# Altium schematic symbol library IC_TI.SCHLIB: 1162 symbols (part 1 of 8) (continued)
## CC2530F128RHAT (continued)
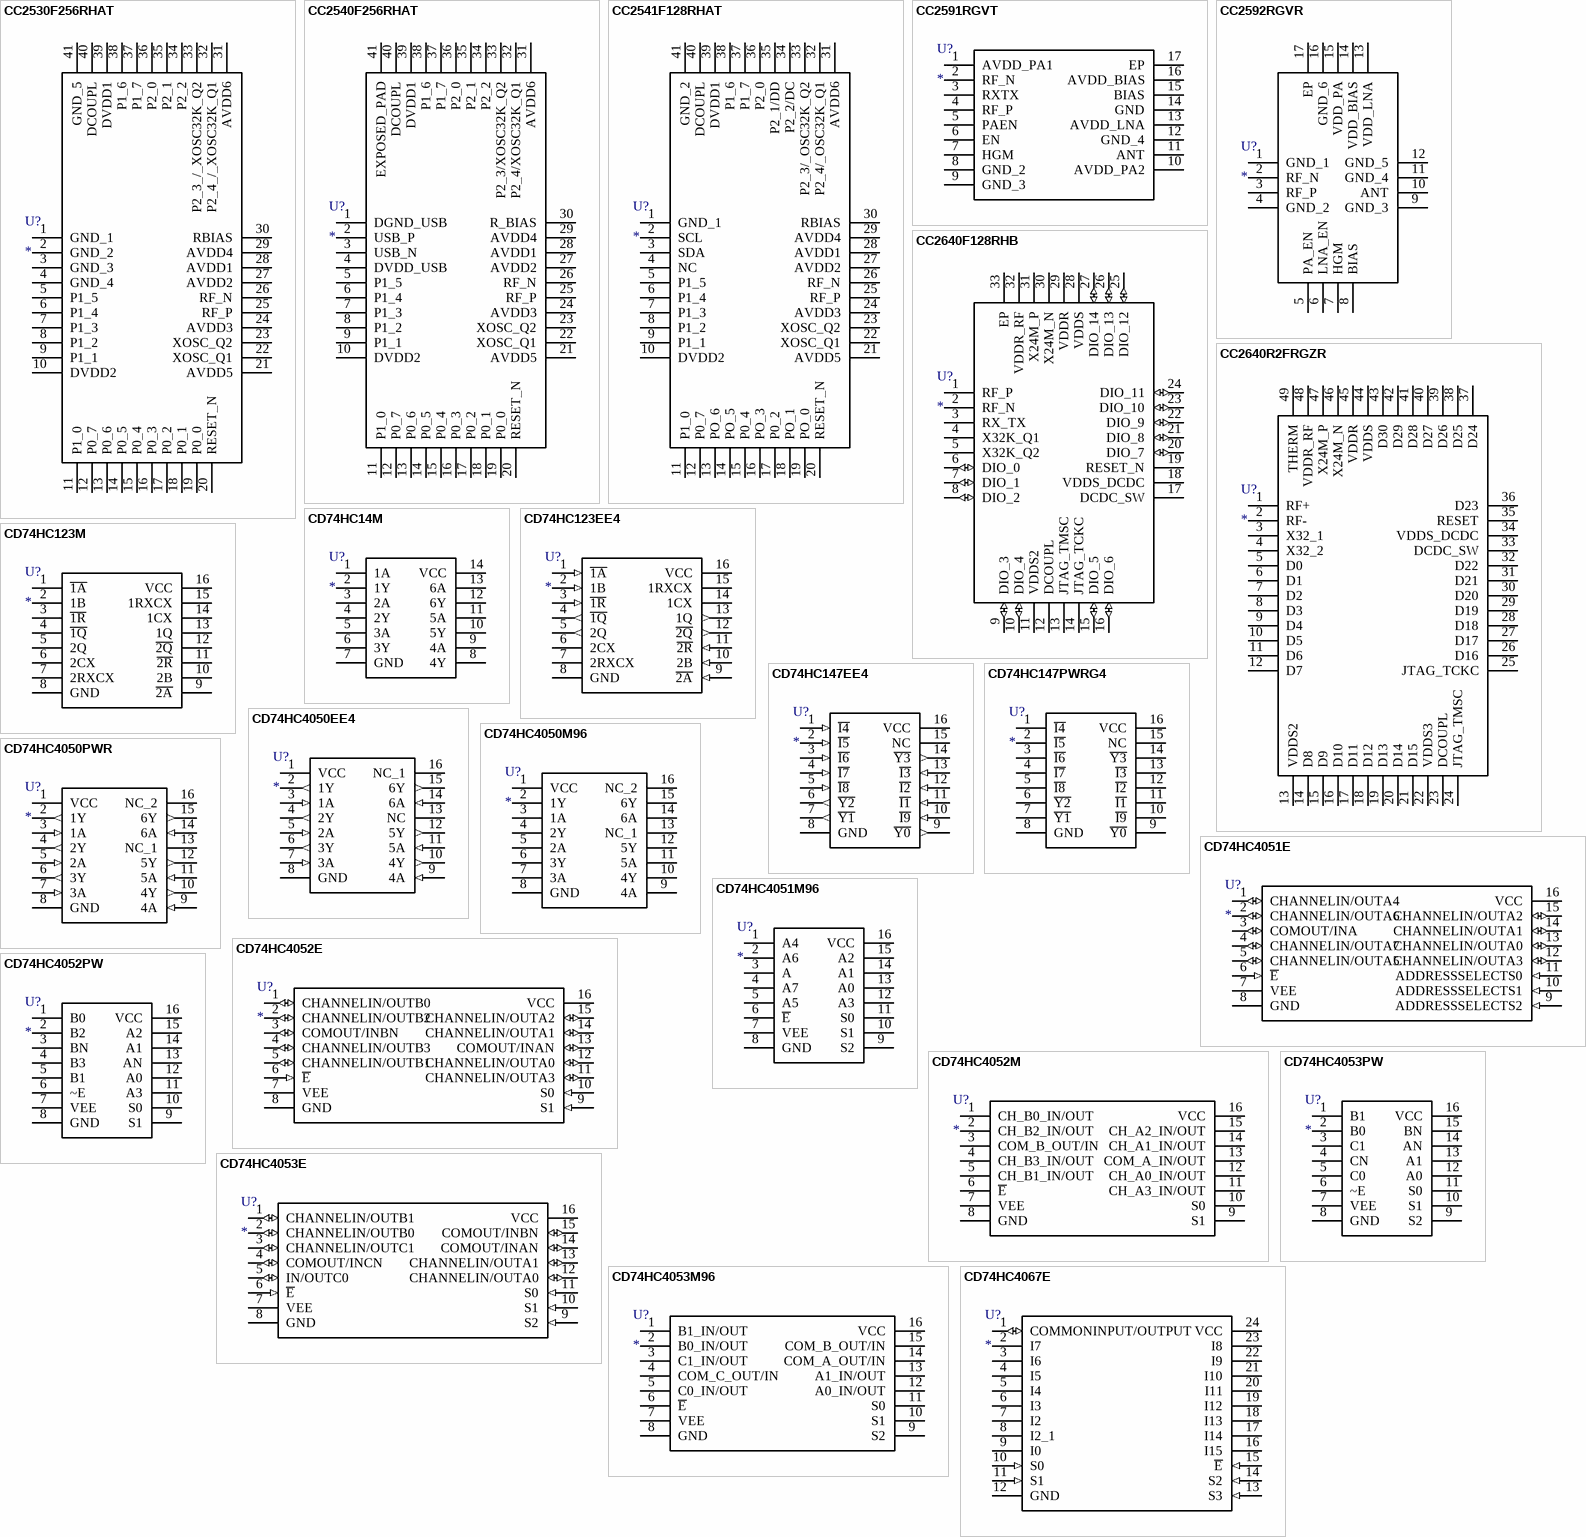
[diagram p2: symbols CC2530F256RHAT to CD74HC4067E]

## CC2530F256RHAT
designator U?
Integrated Circuit; Manufacturer_Name: Texas Instruments; Manufacturer_Part_Number: CC2530F256RHAT; Datasheet Link: http://www.ti.com/lit/ds/symlink/cc2530.pdf; Height: 1mm; Mouser Part Number: 595-CC2530F256RHAT; Mouser Price/Stock: https://www.mouser.com/Search/Refine.aspx?Keyword=595-CC2530F256RHAT; RS Part Number: 6987004P; RS Price/Stock: http://uk.rs-online.com/web/p/products/6987004P
footprint QFN40_0.5-PAD(6X6) (QFN, 40-Leads, Body 6.2x6.2mm (max), Pitch 0.50mm, IPC Low Density)
pins: 1 GND_1, 2 GND_2, 3 GND_3, 4 GND_4, 5 P1_5, 6 P1_4, 7 P1_3, 8 P1_2, 9 P1_1, 10 DVDD2, 11 P1_0, 12 P0_7, 13 P0_6, 14 P0_5, 15 P0_4, 16 P0_3, 17 P0_2, 18 P0_1, 19 P0_0, 20 RESET_N, 21 AVDD5, 22 XOSC_Q1, 23 XOSC_Q2, 24 AVDD3, 25 RF_P, 26 RF_N, 27 AVDD2, 28 AVDD1, 29 AVDD4, 30 RBIAS, 31 AVDD6, 32 P2_4_/_XOSC32K_Q1, 33 P2_3_/_XOSC32K_Q2, 34 P2_2, 35 P2_1, 36 P2_0, 37 P1_7, 38 P1_6, 39 DVDD1, 40 DCOUPL, 41 GND_5

## CC2540F256RHAT
designator U?
Integrated Circuit; Manufacturer_Name: Texas Instruments; Manufacturer_Part_Number: CC2540F256RHAT; Datasheet Link: http://www.ti.com/lit/ds/symlink/cc2540.pdf; Height: 1mm; Mouser Part Number: 595-CC2540F256RHAT; Mouser Price/Stock: https://www.mouser.com/Search/Refine.aspx?Keyword=595-CC2540F256RHAT; RS Part Number: 1684136; RS Price/Stock: http://uk.rs-online.com/web/p/products/1684136
footprint QFN40_0.5-PAD(6X6) (QFN, 40-Leads, Body 6.2x6.2mm (max), Pitch 0.50mm, IPC Low Density)
pins: 1 DGND_USB (power), 2 USB_P, 3 USB_N, 4 DVDD_USB (power), 5 P1_5, 6 P1_4, 7 P1_3, 8 P1_2, 9 P1_1, 10 DVDD2 (power), 11 P1_0, 12 P0_7, 13 P0_6, 14 P0_5, 15 P0_4, 16 P0_3, 17 P0_2, 18 P0_1, 19 P0_0, 20 RESET_N, 21 AVDD5 (power), 22 XOSC_Q1, 23 XOSC_Q2, 24 AVDD3 (power), 25 RF_P, 26 RF_N, 27 AVDD2 (power), 28 AVDD1 (power), 29 AVDD4 (power), 30 R_BIAS, 31 AVDD6 (power), 32 P2_4/XOSC32K_Q1, 33 P2_3/XOSC32K_Q2, 34 P2_2, 35 P2_1, 36 P2_0, 37 P1_7, 38 P1_6, 39 DVDD1 (power), 40 DCOUPL, 41 EXPOSED_PAD

## CC2541F128RHAT
designator U?
Integrated Circuit; Manufacturer_Name: Texas Instruments; Manufacturer_Part_Number: CC2541F128RHAT; Datasheet Link: http://docs-emea.rs-online.com/webdocs/130f/0900766b8130f4c3.pdf; Height: 1mm; Mouser Part Number: 595-CC2541F128RHAT; Mouser Price/Stock: https://www.mouser.com/Search/Refine.aspx?Keyword=595-CC2541F128RHAT; RS Part Number: 1628121; RS Price/Stock: http://china.rs-online.com/web/p/products/1628121
footprint QFN40_0.5-PAD(6X6) (QFN, 40-Leads, Body 6.2x6.2mm (max), Pitch 0.50mm, IPC Low Density)
pins: 1 GND_1 (power), 2 SCL, 3 SDA, 4 NC, 5 P1_5, 6 P1_4, 7 P1_3, 8 P1_2, 9 P1_1, 10 DVDD2 (power), 11 P1_0, 12 P0_7, 13 PO_6, 14 PO_5, 15 P0_4, 16 PO_3, 17 P0_2, 18 PO_1, 19 PO_0, 20 RESET_N, 21 AVDD5 (power), 22 XOSC_Q1, 23 XOSC_Q2, 24 AVDD3 (power), 25 RF_P, 26 RF_N, 27 AVDD2 (power), 28 AVDD1 (power), 29 AVDD4 (power), 30 RBIAS, 31 AVDD6 (power), 32 P2_4/_OSC32K_Q1, 33 P2_3/_OSC32K_Q2, 34 P2_2/DC, 35 P2_1/DD, 36 P2_0, 37 P1_7, 38 P1_6, 39 DVDD1 (power), 40 DCOUPL, 41 GND_2 (power)

## CC2591RGVT
designator U?
Integrated Circuit; Manufacturer_Name: Texas Instruments; Manufacturer_Part_Number: CC2591RGVT; Datasheet Link: http://www.ti.com/lit/gpn/cc2591; Mouser Part Number: 595-CC2591RGVT; Mouser Price/Stock: https://www.mouser.com/Search/Refine.aspx?Keyword=595-CC2591RGVT; RS Part Number: 6658618P; RS Price/Stock: http://uk.rs-online.com/web/p/products/6658618P
footprint QFN16_0.65-PAD(4x4) (QFN, 16-Leads, Body 3.0x3.0mm (max), Pitch 0.50mm, IPC Low Density)
pins: 1 AVDD_PA1, 2 RF_N, 3 RXTX, 4 RF_P, 5 PAEN, 6 EN, 7 HGM, 8 GND_2, 9 GND_3, 10 AVDD_PA2, 11 ANT, 12 GND_4, 13 AVDD_LNA, 14 GND, 15 BIAS, 16 AVDD_BIAS, 17 EP

## CC2592RGVR
designator U?
Integrated Circuit; Manufacturer_Name: Texas Instruments; Manufacturer_Part_Number: CC2592RGVR; Datasheet Link: http://www.ti.com/lit/gpn/cc2592; Height: 1mm; Mouser Part Number: 595-CC2592RGVR; Mouser Price/Stock: https://www.mouser.com/Search/Refine.aspx?Keyword=595-CC2592RGVR
footprint QFN16_0.65-PAD(4x4) (QFN, 16-Leads, Body 3.0x3.0mm (max), Pitch 0.50mm, IPC Low Density)
pins: 1 GND_1, 2 RF_N, 3 RF_P, 4 GND_2, 5 PA_EN, 6 LNA_EN, 7 HGM, 8 BIAS, 9 GND_3, 10 ANT, 11 GND_4, 12 GND_5, 13 VDD_LNA, 14 VDD_BIAS, 15 VDD_PA, 16 GND_6, 17 EP

## CC2640F128RHB
designator U?
Integrated Circuit; Manufacturer_Name: Texas Instruments; Manufacturer_Part_Number: CC2640F128RHB; Datasheet Link: http://www.ti.com/lit/ds/symlink/cc2640.pdf; Height: 1mm
footprint QFN32_0.5-PAD(5X5) (QFN, 32-Leads, Body 5.2x5.2mm (max), Pitch 0.50mm, IPC Medium Density)
pins: 1 RF_P, 2 RF_N, 3 RX_TX, 4 X32K_Q1, 5 X32K_Q2, 6 DIO_0 (io), 7 DIO_1 (io), 8 DIO_2 (io), 9 DIO_3 (io), 10 DIO_4 (io), 11 VDDS2 (power), 12 DCOUPL, 13 JTAG_TMSC, 14 JTAG_TCKC, 15 DIO_5 (io), 16 DIO_6 (io), 17 DCDC_SW, 18 VDDS_DCDC (power), 19 RESET_N, 20 DIO_7 (io), 21 DIO_8 (io), 22 DIO_9 (io), 23 DIO_10 (io), 24 DIO_11 (io), 25 DIO_12 (io), 26 DIO_13 (io), 27 DIO_14 (io), 28 VDDS (power), 29 VDDR (power), 30 X24M_N, 31 X24M_P, 32 VDDR_RF (power), 33 EP

## CC2640R2FRGZR
designator U?
Integrated Circuit; Manufacturer_Name: Texas Instruments; Manufacturer_Part_Number: CC2640R2FRGZR; Datasheet Link: http://www.ti.com/lit/gpn/cc2640r2f; Height: 1mm; Mouser Part Number: 595-CC2640R2FRGZR; Mouser Price/Stock: https://www.mouser.com/Search/Refine.aspx?Keyword=595-CC2640R2FRGZR
footprint QFN48_0.5-PAD(7X7) (QFN, 48-Leads, Body 7.2x7.2mm (max), Pitch 0.50mm, IPC Medium Density)
pins: 1 RF+, 2 RF-, 3 X32_1, 4 X32_2, 5 D0, 6 D1, 7 D2, 8 D3, 9 D4, 10 D5, 11 D6, 12 D7, 13 VDDS2, 14 D8, 15 D9, 16 D10, 17 D11, 18 D12, 19 D13, 20 D14, 21 D15, 22 VDDS3, 23 DCOUPL, 24 JTAG_TMSC, 25 JTAG_TCKC, 26 D16, 27 D17, 28 D18, 29 D19, 30 D20, 31 D21, 32 D22, 33 DCDC_SW, 34 VDDS_DCDC, 35 RESET, 36 D23, 37 D24, 38 D25, 39 D26, 40 D27, 41 D28, 42 D29, 43 D30, 44 VDDS, 45 VDDR, 46 X24M_N, 47 X24M_P, 48 VDDR_RF, 49 THERM

## CD74HC14M
designator U?
Integrated Circuit; Manufacturer_Name: Texas Instruments; Manufacturer_Part_Number: CD74HC14M; Datasheet Link: http://docs-emea.rs-online.com/webdocs/0ca1/0900766b80ca103b.pdf; Height: 1.75mm; Mouser Part Number: 595-CD74HC14M; Mouser Price/Stock: https://www.mouser.com/Search/Refine.aspx?Keyword=595-CD74HC14M; RS Part Number: 1450149; RS Price/Stock: http://uk.rs-online.com/web/p/products/1450149
footprint SOIC14_1.27
pins: 1 1A, 2 1Y, 3 2A, 4 2Y, 5 3A, 6 3Y, 7 GND (power), 8 4Y, 9 4A, 10 5Y, 11 5A, 12 6Y, 13 6A, 14 VCC (power)

## CD74HC123EE4
designator U?
Integrated Circuit; Manufacturer_Name: Texas Instruments; Manufacturer_Part_Number: CD74HC123EE4; Datasheet Link: http://www.ti.com/lit/ds/symlink/cd74hc123.pdf; Height: 5.08mm; Mouser Part Number: 595-CD74HC123EE4; Mouser Price/Stock: https://www.mouser.com/Search/Refine.aspx?Keyword=595-CD74HC123EE4; RS Part Number: 7092071P; RS Price/Stock: http://uk.rs-online.com/web/p/products/7092071P
footprint DIP16-A
pins: 1 ~{1A} (in), 2 1B (in), 3 ~{1R} (in), 4 ~{1Q} (out), 5 2Q (out), 6 2CX, 7 2RXCX, 8 GND (power), 9 ~{2A} (in), 10 2B (in), 11 ~{2R} (in), 12 ~{2Q} (out), 13 1Q (out), 14 1CX, 15 1RXCX, 16 VCC (power)

## CD74HC123M
designator U?
Integrated Circuit; Manufacturer_Name: Texas Instruments; Manufacturer_Part_Number: CD74HC123M; Datasheet Link: http://www.ti.com/lit/ds/symlink/cd74hc123.pdf; Height: 1.75mm; Mouser Part Number: 595-CD74HC123M; Mouser Price/Stock: https://www.mouser.com/Search/Refine.aspx?Keyword=595-CD74HC123M; RS Part Number: 6630014P; RS Price/Stock: http://uk.rs-online.com/web/p/products/6630014P
footprint SOIC16_1.27
pins: 1 ~{1A}, 2 1B, 3 ~{1R}, 4 ~{1Q}, 5 2Q, 6 2CX, 7 2RXCX, 8 GND, 9 ~{2A}, 10 2B, 11 ~{2R}, 12 ~{2Q}, 13 1Q, 14 1CX, 15 1RXCX, 16 VCC

## CD74HC147EE4
designator U?
Integrated Circuit; Manufacturer_Name: Texas Instruments; Manufacturer_Part_Number: CD74HC147EE4; Datasheet Link: http://www.ti.com/lit/ds/symlink/cd74hc147.pdf; Height: 5.08mm; Mouser Part Number: 595-CD74HC147EE4; Mouser Price/Stock: https://www.mouser.com/Search/Refine.aspx?Keyword=595-CD74HC147EE4; RS Part Number: 1450477; RS Price/Stock: http://uk.rs-online.com/web/p/products/1450477
footprint DIP16-A
pins: 1 ~{I4} (in), 2 ~{I5} (in), 3 ~{I6} (in), 4 ~{I7} (in), 5 ~{I8} (in), 6 ~{Y2} (out), 7 ~{Y1} (out), 8 GND (power), 9 ~{Y0} (out), 10 ~{I9} (in), 11 ~{I1} (in), 12 ~{I2} (in), 13 ~{I3} (in), 14 ~{Y3} (out), 15 NC, 16 VCC (power)

## CD74HC147PWRG4
designator U?
Integrated Circuit; Manufacturer_Name: Texas Instruments; Manufacturer_Part_Number: CD74HC147PWRG4; Datasheet Link: http://www.ti.com/lit/ds/symlink/cd74hc147.pdf; Height: 1.2mm; Mouser Part Number: 595-CD74HC147PWRG4; Mouser Price/Stock: https://www.mouser.com/Search/Refine.aspx?Keyword=595-CD74HC147PWRG4
footprint TSSOP16_0.65 (Shrink Small Outline; 16 Leads; Body Width 4.4 mm; Pitch 0.65 mm)
pins: 1 ~{I4}, 2 ~{I5}, 3 ~{I6}, 4 ~{I7}, 5 ~{I8}, 6 ~{Y2}, 7 ~{Y1}, 8 GND, 9 ~{Y0}, 10 ~{I9}, 11 ~{I1}, 12 ~{I2}, 13 ~{I3}, 14 ~{Y3}, 15 NC, 16 VCC

## CD74HC4050EE4
designator U?
Integrated Circuit; Manufacturer_Name: Texas Instruments; Manufacturer_Part_Number: CD74HC4050EE4; Datasheet Link: http://www.ti.com/lit/ds/symlink/cd74hc4050.pdf; Height: 5.08mm; Mouser Part Number: 595-CD74HC4050EE4; Mouser Price/Stock: https://www.mouser.com/Search/Refine.aspx?Keyword=595-CD74HC4050EE4; RS Part Number: 1450019; RS Price/Stock: http://uk.rs-online.com/web/p/products/1450019
footprint DIP16-A
pins: 1 VCC (power), 2 1Y (out), 3 1A (in), 4 2Y (out), 5 2A (in), 6 3Y (out), 7 3A (in), 8 GND (power), 9 4A (in), 10 4Y (out), 11 5A (in), 12 5Y (out), 13 NC, 14 6A (in), 15 6Y (out), 16 NC_1

## CD74HC4050M96
designator U?
Integrated Circuit; Manufacturer_Name: Texas Instruments; Manufacturer_Part_Number: CD74HC4050M96; Datasheet Link: http://www.ti.com/lit/gpn/cd74hc4050; Height: 1.75mm; Mouser Part Number: 595-CD74HC4050M96; Mouser Price/Stock: https://www.mouser.com/Search/Refine.aspx?Keyword=595-CD74HC4050M96; RS Part Number: 6627137P; RS Price/Stock: http://uk.rs-online.com/web/p/products/6627137P
footprint SOIC16_1.27
pins: 1 VCC, 2 1Y, 3 1A, 4 2Y, 5 2A, 6 3Y, 7 3A, 8 GND, 9 4A, 10 4Y, 11 5A, 12 5Y, 13 NC_1, 14 6A, 15 6Y, 16 NC_2

## CD74HC4050PWR
designator U?
Integrated Circuit; Manufacturer_Name: Texas Instruments; Manufacturer_Part_Number: CD74HC4050PWR; Datasheet Link: http://www.ti.com/lit/ds/symlink/cd74hc4049.pdf; Height: 1.2mm; Mouser Part Number: 595-CD74HC4050PWR; Mouser Price/Stock: https://www.mouser.com/Search/Refine.aspx?Keyword=595-CD74HC4050PWR; RS Part Number: 6627131P; RS Price/Stock: http://uk.rs-online.com/web/p/products/6627131P
footprint TSSOP16_0.65 (Shrink Small Outline; 16 Leads; Body Width 4.4 mm; Pitch 0.65 mm)
pins: 1 VCC (power), 2 1Y (out), 3 1A (in), 4 2Y (out), 5 2A (in), 6 3Y (out), 7 3A (in), 8 GND (power), 9 4A (in), 10 4Y (out), 11 5A (in), 12 5Y (out), 13 NC_1, 14 6A (in), 15 6Y (out), 16 NC_2

## CD74HC4051E
designator U?
Integrated Circuit; Manufacturer_Name: Texas Instruments; Manufacturer_Part_Number: CD74HC4051E; Datasheet Link: http://www.ti.com/lit/ds/symlink/cd74hc4051.pdf; Height: 5.08mm; Mouser Part Number: 595-CD74HC4051E; Mouser Price/Stock: https://www.mouser.com/Search/Refine.aspx?Keyword=595-CD74HC4051E; RS Part Number: 2508240054; RS Price/Stock: http://uk.rs-online.com/web/p/products/2508240054
footprint DIP16-A
pins: 1 CHANNELIN/OUTA4 (io), 2 CHANNELIN/OUTA6 (io), 3 COMOUT/INA (io), 4 CHANNELIN/OUTA7 (io), 5 CHANNELIN/OUTA5 (io), 6 ~{E} (in), 7 VEE (power), 8 GND (power), 9 ADDRESSSELECTS2 (in), 10 ADDRESSSELECTS1 (in), 11 ADDRESSSELECTS0 (in), 12 CHANNELIN/OUTA3 (io), 13 CHANNELIN/OUTA0 (io), 14 CHANNELIN/OUTA1 (io), 15 CHANNELIN/OUTA2 (io), 16 VCC (power)

## CD74HC4051M96
designator U?
Integrated Circuit; Manufacturer_Name: Texas Instruments; Manufacturer_Part_Number: CD74HC4051M96; Datasheet Link: http://www.ti.com/lit/ds/symlink/cd74hc4051.pdf; Height: 1.75mm; Mouser Part Number: 595-CD74HC4051M96; Mouser Price/Stock: https://www.mouser.com/Search/Refine.aspx?Keyword=595-CD74HC4051M96; RS Part Number: 1788943; RS Price/Stock: http://uk.rs-online.com/web/p/products/1788943
footprint SOIC16_1.27
pins: 1 A4, 2 A6, 3 A, 4 A7, 5 A5, 6 ~{E}, 7 VEE, 8 GND (power), 9 S2, 10 S1, 11 S0, 12 A3, 13 A0, 14 A1, 15 A2, 16 VCC (power)

## CD74HC4052E
designator U?
Integrated Circuit; Manufacturer_Name: Texas Instruments; Manufacturer_Part_Number: CD74HC4052E; Datasheet Link: http://www.ti.com/lit/ds/symlink/cd74hc4051.pdf; Height: 5.08mm; Mouser Part Number: 595-CD74HC4052E; Mouser Price/Stock: https://www.mouser.com/Search/Refine.aspx?Keyword=595-CD74HC4052E; RS Part Number: 0527754; RS Price/Stock: http://uk.rs-online.com/web/p/products/0527754
footprint DIP16-A
pins: 1 CHANNELIN/OUTB0 (io), 2 CHANNELIN/OUTB2 (io), 3 COMOUT/INBN (io), 4 CHANNELIN/OUTB3 (io), 5 CHANNELIN/OUTB1 (io), 6 ~{E} (in), 7 VEE (power), 8 GND (power), 9 S1 (in), 10 S0 (in), 11 CHANNELIN/OUTA3 (io), 12 CHANNELIN/OUTA0 (io), 13 COMOUT/INAN (io), 14 CHANNELIN/OUTA1 (io), 15 CHANNELIN/OUTA2 (io), 16 VCC (power)

## CD74HC4052M
designator U?
Integrated Circuit; Manufacturer_Name: Texas Instruments; Manufacturer_Part_Number: CD74HC4052M; Datasheet Link: http://www.ti.com/lit/ds/symlink/cd74hc4052.pdf; Height: 1.75mm; Mouser Part Number: 595-CD74HC4052M; Mouser Price/Stock: https://www.mouser.com/Search/Refine.aspx?Keyword=595-CD74HC4052M; RS Part Number: 6622684P; RS Price/Stock: http://uk.rs-online.com/web/p/products/6622684P
footprint SOIC16_1.27
pins: 1 CH_B0_IN/OUT, 2 CH_B2_IN/OUT, 3 COM_B_OUT/IN, 4 CH_B3_IN/OUT, 5 CH_B1_IN/OUT, 6 ~{E}, 7 VEE, 8 GND, 9 S1, 10 S0, 11 CH_A3_IN/OUT, 12 CH_A0_IN/OUT, 13 COM_A_IN/OUT, 14 CH_A1_IN/OUT, 15 CH_A2_IN/OUT, 16 VCC

## CD74HC4052PW
designator U?
Integrated Circuit; Manufacturer_Name: Texas Instruments; Manufacturer_Part_Number: CD74HC4052PW; Mouser Part Number: 595-CD74HC4052PW; Mouser Price/Stock: https://www.mouser.com/Search/Refine.aspx?Keyword=595-CD74HC4052PW
footprint TSSOP16_0.65 (Shrink Small Outline; 16 Leads; Body Width 4.4 mm; Pitch 0.65 mm)
pins: 1 B0, 2 B2, 3 BN, 4 B3, 5 B1, 6 ~E, 7 VEE, 8 GND, 9 S1, 10 S0, 11 A3, 12 A0, 13 AN, 14 A1, 15 A2, 16 VCC

## CD74HC4053E
designator U?
Integrated Circuit; Manufacturer_Name: Texas Instruments; Manufacturer_Part_Number: CD74HC4053E; Datasheet Link: http://www.ti.com/lit/ds/symlink/cd74hc4051.pdf; Height: 5.08mm; Mouser Part Number: 595-CD74HC4053E; Mouser Price/Stock: https://www.mouser.com/Search/Refine.aspx?Keyword=595-CD74HC4053E; RS Part Number: 2508240111; RS Price/Stock: http://uk.rs-online.com/web/p/products/2508240111
footprint DIP16-A
pins: 1 CHANNELIN/OUTB1 (io), 2 CHANNELIN/OUTB0 (io), 3 CHANNELIN/OUTC1 (io), 4 COMOUT/INCN (io), 5 IN/OUTC0 (io), 6 ~{E} (in), 7 VEE (power), 8 GND (power), 9 S2 (in), 10 S1 (in), 11 S0 (in), 12 CHANNELIN/OUTA0 (io), 13 CHANNELIN/OUTA1 (io), 14 COMOUT/INAN (io), 15 COMOUT/INBN (io), 16 VCC (power)

## CD74HC4053M96
designator U?
Integrated Circuit; Manufacturer_Name: Texas Instruments; Manufacturer_Part_Number: CD74HC4053M96; Datasheet Link: http://www.ti.com/lit/ds/symlink/cd74hc4053.pdf; Height: 1.75mm; Mouser Part Number: 595-CD74HC4053M96; Mouser Price/Stock: https://www.mouser.com/Search/Refine.aspx?Keyword=595-CD74HC4053M96; RS Part Number: 6622561P; RS Price/Stock: http://uk.rs-online.com/web/p/products/6622561P
footprint SOIC16_1.27
pins: 1 B1_IN/OUT, 2 B0_IN/OUT, 3 C1_IN/OUT, 4 COM_C_OUT/IN, 5 C0_IN/OUT, 6 ~{E}, 7 VEE, 8 GND, 9 S2, 10 S1, 11 S0, 12 A0_IN/OUT, 13 A1_IN/OUT, 14 COM_A_OUT/IN, 15 COM_B_OUT/IN, 16 VCC

## CD74HC4053PW
designator U?
Integrated Circuit; Manufacturer_Name: Texas Instruments; Manufacturer_Part_Number: CD74HC4053PW; Datasheet Link: http://componentsearchengine.com/Datasheets/1/CD74HC4053PW.pdf; Mouser Part Number: 595-CD74HC4053PW; Mouser Price/Stock: https://www.mouser.com/Search/Refine.aspx?Keyword=595-CD74HC4053PW; RS Part Number: 6622681P; RS Price/Stock: http://uk.rs-online.com/web/p/products/6622681P
footprint TSSOP16_0.65 (Shrink Small Outline; 16 Leads; Body Width 4.4 mm; Pitch 0.65 mm)
pins: 1 B1, 2 B0, 3 C1, 4 CN, 5 C0, 6 ~E, 7 VEE, 8 GND, 9 S2, 10 S1, 11 S0, 12 A0, 13 A1, 14 AN, 15 BN, 16 VCC

## CD74HC4067E
designator U?
Integrated Circuit; Manufacturer_Name: Texas Instruments; Manufacturer_Part_Number: CD74HC4067E; Datasheet Link: http://docs-emea.rs-online.com/webdocs/13d3/0900766b813d37cd.pdf; Height: 5.08mm; Mouser Part Number: 595-CD74HC4067E; Mouser Price/Stock: https://www.mouser.com/Search/Refine.aspx?Keyword=595-CD74HC4067E; RS Part Number: 6622707P; RS Price/Stock: http://uk.rs-online.com/web/p/products/6622707P
footprint DIP24W
pins: 1 COMMONINPUT/OUTPUT (io), 2 I7, 3 I6, 4 I5, 5 I4, 6 I3, 7 I2, 8 I2_1, 9 I0, 10 S0 (in), 11 S1 (in), 12 GND (power), 13 S3 (in), 14 S2 (in), 15 ~{E} (in), 16 I15, 17 I14, 18 I13, 19 I12, 20 I11, 21 I10, 22 I9, 23 I8, 24 VCC (power)

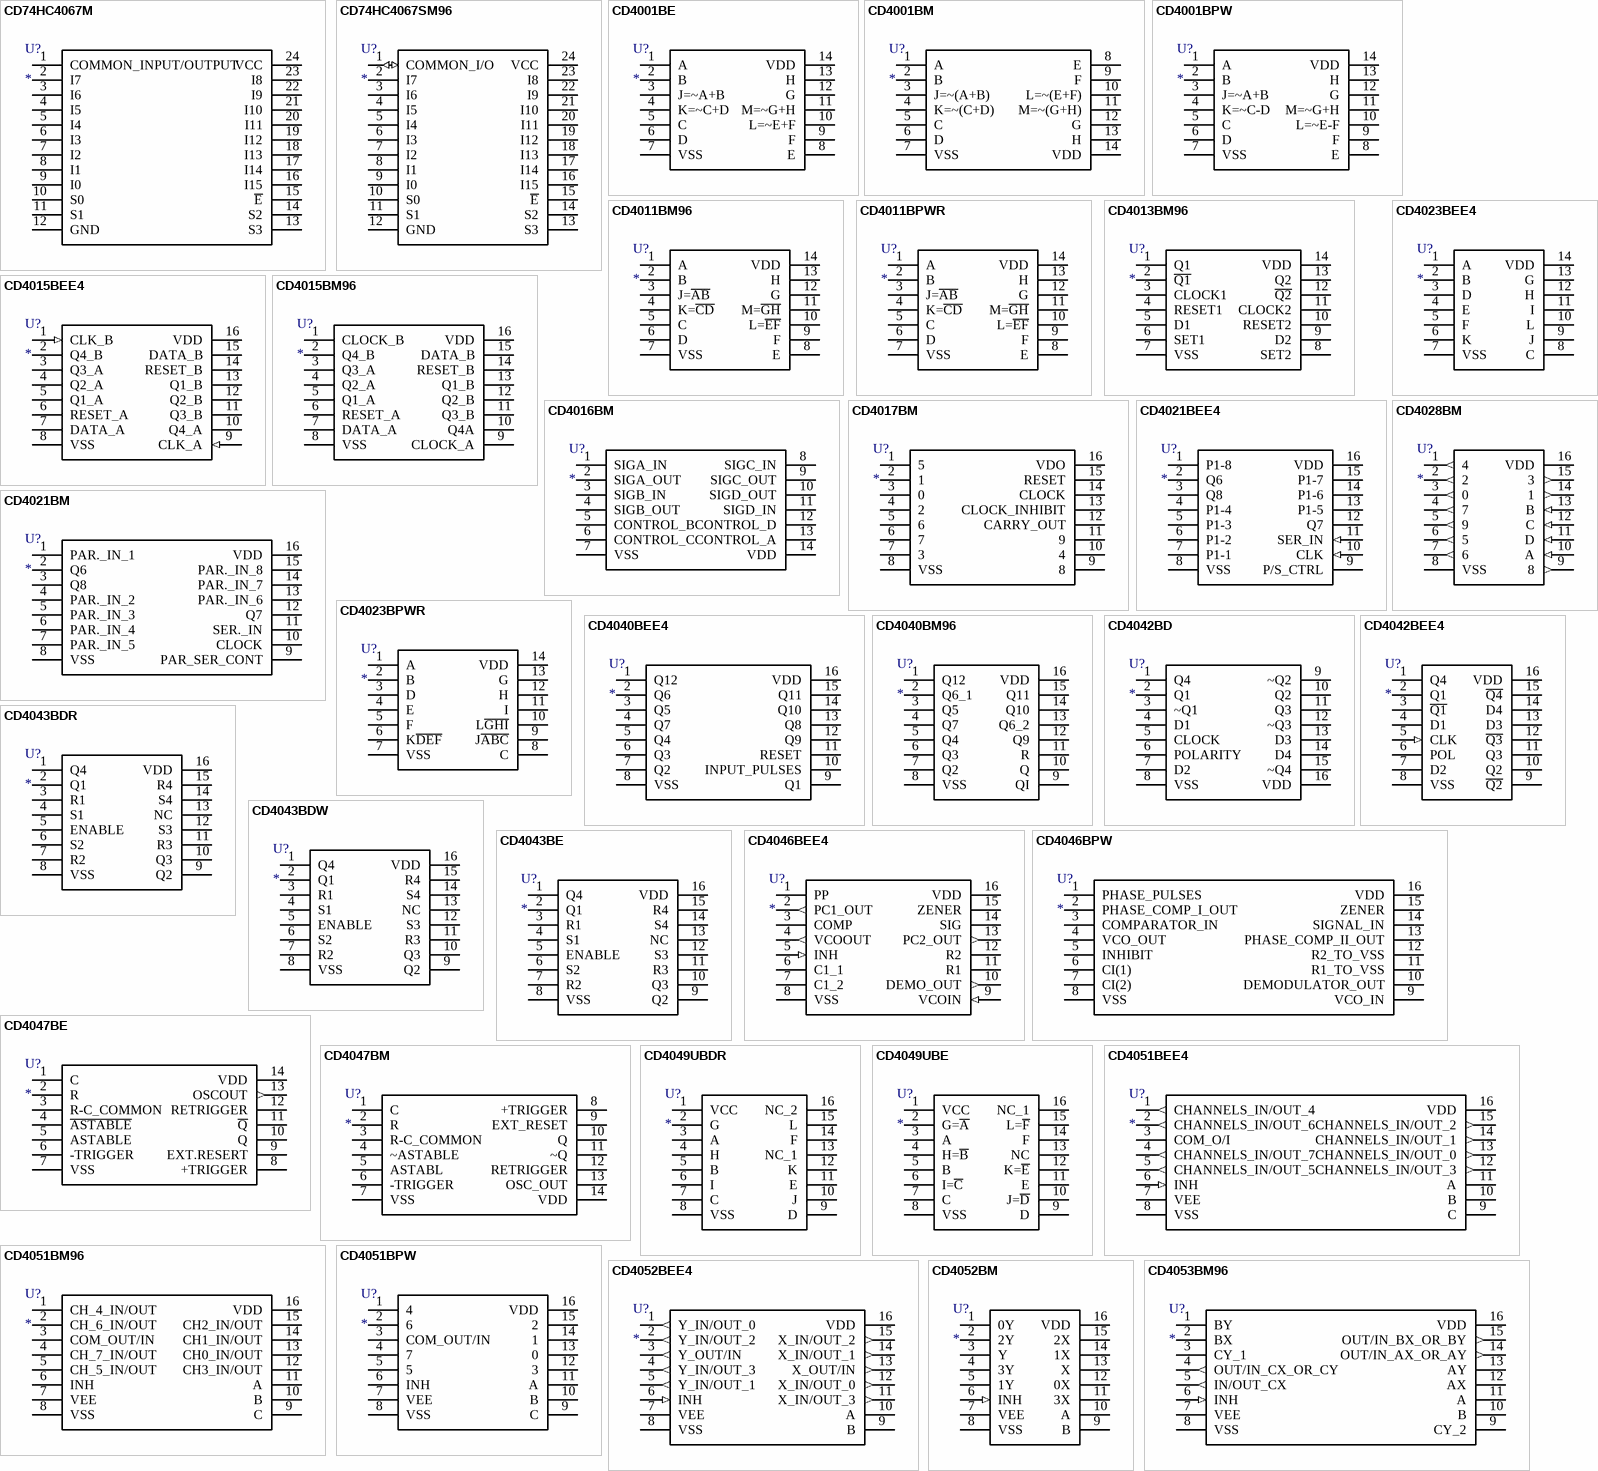
[diagram p3: symbols CD74HC4067M to CD4053BM96]

## CD74HC4067M
designator U?
Integrated Circuit; Manufacturer_Name: Texas Instruments; Manufacturer_Part_Number: CD74HC4067M; Datasheet Link: http://www.ti.com/lit/ds/symlink/cd74hc4067.pdf; Height: 2.65mm; Mouser Part Number: 595-CD74HC4067M; Mouser Price/Stock: https://www.mouser.com/Search/Refine.aspx?Keyword=595-CD74HC4067M; RS Part Number: 1626958; RS Price/Stock: http://uk.rs-online.com/web/p/products/1626958
footprint SOIC24W_1.27
pins: 1 COMMON_INPUT/OUTPUT, 2 I7, 3 I6, 4 I5, 5 I4, 6 I3, 7 I2, 8 I1, 9 I0, 10 S0, 11 S1, 12 GND, 13 S3, 14 S2, 15 ~{E}, 16 I15, 17 I14, 18 I13, 19 I12, 20 I11, 21 I10, 22 I9, 23 I8, 24 VCC

## CD74HC4067SM96
designator U?
Integrated Circuit; Manufacturer_Name: Texas Instruments; Manufacturer_Part_Number: CD74HC4067SM96; Datasheet Link: http://docs-emea.rs-online.com/webdocs/0c95/0900766b80c95708.pdf; Height: 2mm; Mouser Part Number: 595-CD74HC4067SM96; Mouser Price/Stock: https://www.mouser.com/Search/Refine.aspx?Keyword=595-CD74HC4067SM96; RS Part Number: 6622570P; RS Price/Stock: http://uk.rs-online.com/web/p/products/6622570P
footprint TSSOP24W_0.65 (TSOP, 24-Leads, Body 7.80x4.40mm, Pitch 0.65mm, Thermal Pad 5.16x2.40mm, IPC Low Density)
pins: 1 COMMON_I/O (io), 2 I7, 3 I6, 4 I5, 5 I4, 6 I3, 7 I2, 8 I1, 9 I0, 10 S0, 11 S1, 12 GND (power), 13 S3, 14 S2, 15 ~{E}, 16 I15, 17 I14, 18 I13, 19 I12, 20 I11, 21 I10, 22 I9, 23 I8, 24 VCC (power)

## CD4001BE
designator U?
Integrated Circuit; Manufacturer_Name: Texas Instruments; Manufacturer_Part_Number: CD4001BE; Datasheet Link: http://www.ti.com/lit/gpn/cd4001b; Mouser Part Number: 595-CD4001BE; Mouser Price/Stock: https://www.mouser.com/Search/Refine.aspx?Keyword=595-CD4001BE
footprint DIP14
pins: 1 A, 2 B, 3 J=~A+B, 4 K=~C+D, 5 C, 6 D, 7 VSS, 8 E, 9 F, 10 L=~E+F, 11 M=~G+H, 12 G, 13 H, 14 VDD

## CD4001BM
designator U?
Integrated Circuit; Manufacturer_Name: Texas Instruments; Manufacturer_Part_Number: CD4001BM; Datasheet Link: http://www.ti.com/lit/gpn/cd4001b; Mouser Part Number: 595-CD4001BM; Mouser Price/Stock: https://www.mouser.com/Search/Refine.aspx?Keyword=595-CD4001BM; RS Part Number: 1792136; RS Price/Stock: http://uk.rs-online.com/web/p/products/1792136
footprint SOIC14_1.27
pins: 1 A, 2 B, 3 J=~(A+B), 4 K=~(C+D), 5 C, 6 D, 7 VSS, 8 E, 9 F, 10 L=~(E+F), 11 M=~(G+H), 12 G, 13 H, 14 VDD

## CD4001BPW
designator U?
Integrated Circuit; Manufacturer_Name: Texas Instruments; Manufacturer_Part_Number: CD4001BPW; Mouser Part Number: 595-CD4001BPW; Mouser Price/Stock: https://www.mouser.com/Search/Refine.aspx?Keyword=595-CD4001BPW; RS Part Number: 8096157P; RS Price/Stock: http://uk.rs-online.com/web/p/products/8096157P
footprint TSSOP14_0.65 (TSOP, 14-Leads, Body 5.00x4.40mm, Pitch 0.65mm, Thermal Pad 2.31x2.46mm, IPC Low Density)
pins: 1 A, 2 B, 3 J=~A+B, 4 K=~C-D, 5 C, 6 D, 7 VSS, 8 E, 9 F, 10 L=~E-F, 11 M=~G+H, 12 G, 13 H, 14 VDD

## CD4011BM96
designator U?
Integrated Circuit; Manufacturer_Name: Texas Instruments; Manufacturer_Part_Number: CD4011BM96; Datasheet Link: http://www.ti.com/lit/gpn/cd4011b; Height: 1.75mm; Mouser Part Number: 595-CD4011BM96; Mouser Price/Stock: https://www.mouser.com/Search/Refine.aspx?Keyword=595-CD4011BM96; RS Part Number: 1792116; RS Price/Stock: http://uk.rs-online.com/web/p/products/1792116
footprint SOIC14_1.27
pins: 1 A, 2 B, 3 J=~{AB}, 4 K=~{CD}, 5 C, 6 D, 7 VSS, 8 E, 9 F, 10 L=~{EF}, 11 M=~{GH}, 12 G, 13 H, 14 VDD

## CD4011BPWR
designator U?
Integrated Circuit; Manufacturer_Name: Texas Instruments; Manufacturer_Part_Number: CD4011BPWR; Datasheet Link: http://www.ti.com/lit/gpn/cd4011b; Height: 1.2mm; Mouser Part Number: 595-CD4011BPWR; Mouser Price/Stock: https://www.mouser.com/Search/Refine.aspx?Keyword=595-CD4011BPWR; RS Part Number: 6626813P; RS Price/Stock: http://uk.rs-online.com/web/p/products/6626813P
footprint TSSOP14_0.65 (TSOP, 14-Leads, Body 5.00x4.40mm, Pitch 0.65mm, Thermal Pad 2.31x2.46mm, IPC Low Density)
pins: 1 A, 2 B, 3 J=~{AB}, 4 K=~{CD}, 5 C, 6 D, 7 VSS, 8 E, 9 F, 10 L=~{EF}, 11 M=~{GH}, 12 G, 13 H, 14 VDD
